# Altium footprint library FOOTPRINT.PcbLib: 132 footprints (part 6 of 9)
Each footprint in its own frame and in the unit in brackets; x right, y up, seen from the top. Pads: shape width x height; smd on the part's side, far side on the other; paste and mask are expansions set on the pad; w line width, h text height; cw(c..) or ccw(c..) is an arc to the next point about the centre after c.
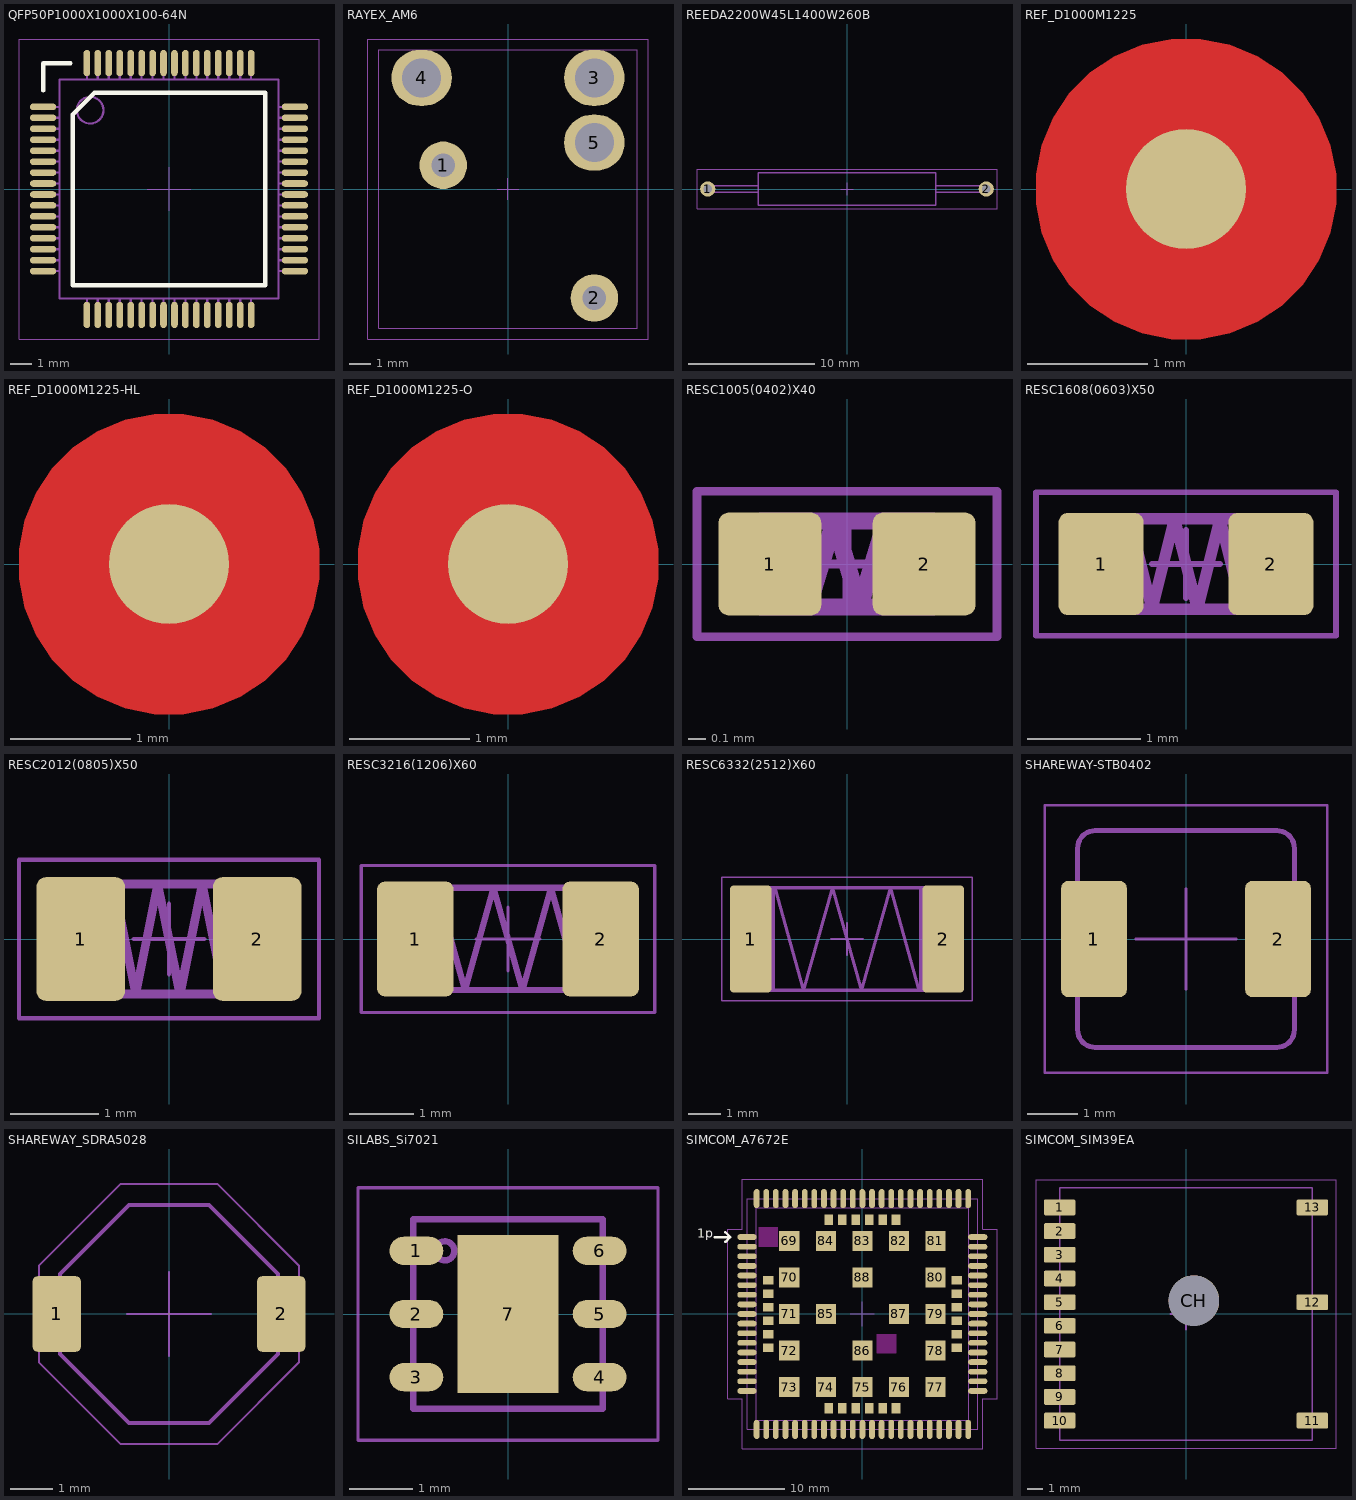
[diagram p5: the footprints below, top view; thin cyan lines are the x and y axes]

## QFP50P1000X1000X100-64N [mm] "TQFP, 64-Leads, Body 10.00x10.00mm, Pitch 0.50mm"
height 1
pads (64):
  oval 1.2x0.3 smd paste-0.025: 1(-5.75,3.75) 2(-5.75,3.25) 3(-5.75,2.75) 4(-5.75,2.25) 5(-5.75,1.75) 6(-5.75,1.25) 7(-5.75,0.75) 8(-5.75,0.25) 9(-5.75,-0.25) 10(-5.75,-0.75) 11(-5.75,-1.25) 12(-5.75,-1.75) 13(-5.75,-2.25) 14(-5.75,-2.75) 15(-5.75,-3.25) 16(-5.75,-3.75) 33(5.75,-3.75) 34(5.75,-3.25) 35(5.75,-2.75) 36(5.75,-2.25) 37(5.75,-1.75) 38(5.75,-1.25) 39(5.75,-0.75) 40(5.75,-0.25) 41(5.75,0.25) 42(5.75,0.75) 43(5.75,1.25) 44(5.75,1.75) 45(5.75,2.25) 46(5.75,2.75) 47(5.75,3.25) 48(5.75,3.75)
  oval 0.3x1.2 smd paste-0.025: 17(-3.75,-5.75) 18(-3.25,-5.75) 19(-2.75,-5.75) 20(-2.25,-5.75) 21(-1.75,-5.75) 22(-1.25,-5.75) 23(-0.75,-5.75) 24(-0.25,-5.75) 25(0.25,-5.75) 26(0.75,-5.75) 27(1.25,-5.75) 28(1.75,-5.75) 29(2.25,-5.75) 30(2.75,-5.75) 31(3.25,-5.75) 32(3.75,-5.75) 49(3.75,5.75) 50(3.25,5.75) 51(2.75,5.75) 52(2.25,5.75) 53(1.75,5.75) 54(1.25,5.75) 55(0.75,5.75) 56(0.25,5.75) 57(-0.25,5.75) 58(-0.75,5.75) 59(-1.25,5.75) 60(-1.75,5.75) 61(-2.25,5.75) 62(-2.75,5.75) 63(-3.25,5.75) 64(-3.75,5.75)
Top Overlay:
  lines w0.2: -5.75,4.5 -5.75,5.75 -4.5,5.75 ; -4.4,-4.4 -4.4,3.4 -3.4,4.4 4.4,4.4 4.4,-4 4.4,-4.4 -2.975,-4.4 -4.4,-4.4
Top Assembly:
  circle w0.1: c-3.6,3.6 r0.608
  lines w0.1: -6,-3.75 -5,-3.75 ; -6,-3.25 -5,-3.25 ; -6,-2.75 -5,-2.75 ; -6,-2.25 -5,-2.25 ; -6,-1.75 -5,-1.75 ; -6,-1.25 -5,-1.25 ; -6,-0.75 -5,-0.75 ; -6,-0.25 -5,-0.25 ; -6,0.25 -5,0.25 ; -6,0.75 -5,0.75 ; -6,1.25 -5,1.25 ; -6,1.75 -5,1.75 ; -6,2.25 -5,2.25 ; -6,2.75 -5,2.75 ; -6,3.25 -5,3.25 ; -6,3.75 -5,3.75 ; -3.75,-6 -3.75,-5 ; -3.75,5 -3.75,6 ; -3.25,-6 -3.25,-5 ; -3.25,5 -3.25,6 ; -2.75,-6 -2.75,-5 ; -2.75,5 -2.75,6 ; -2.25,-6 -2.25,-5 ; -2.25,5 -2.25,6 ; -1.75,-6 -1.75,-5 ; -1.75,5 -1.75,6 ; -1.25,-6 -1.25,-5 ; -1.25,5 -1.25,6 ; -0.75,-6 -0.75,-5 ; -0.75,5 -0.75,6 ; -0.25,-6 -0.25,-5 ; -0.25,5 -0.25,6 ; 0.25,-6 0.25,-5 ; 0.25,5 0.25,6 ; 0.75,-6 0.75,-5 ; 0.75,5 0.75,6 ; 1.25,-6 1.25,-5 ; 1.25,5 1.25,6 ; 1.75,-6 1.75,-5 ; 1.75,5 1.75,6 ; 2.25,-6 2.25,-5 ; 2.25,5 2.25,6 ; 2.75,-6 2.75,-5 ; 2.75,5 2.75,6 ; 3.25,-6 3.25,-5 ; 3.25,5 3.25,6 ; 3.75,-6 3.75,-5 ; 3.75,5 3.75,6 ; 5,-3.75 6,-3.75 ; 5,-3.25 6,-3.25 ; 5,-2.75 6,-2.75 ; 5,-2.25 6,-2.25 ; 5,-1.75 6,-1.75 ; 5,-1.25 6,-1.25 ; 5,-0.75 6,-0.75 ; 5,-0.25 6,-0.25 ; 5,0.25 6,0.25 ; 5,0.75 6,0.75 ; 5,1.25 6,1.25 ; 5,1.75 6,1.75 ; 5,2.25 6,2.25 ; 5,2.75 6,2.75 ; 5,3.25 6,3.25 ; 5,3.75 6,3.75 ; -5,-5 5,-5 5,5 -5,5 -5,-5
Top Courtyard:
  lines w0.05: -6.85,-6.85 6.85,-6.85 6.85,6.85 -6.85,6.85 -6.85,-6.85
Top Component Center:
  lines w0.05: -1,0 1,0 ; 0,-1 0,1
Top Designator:
  text "'.Comment'" at -1.425,-0.81 h0.65
  text "'.Designator'" at -1.425,0.351 h0.65
3D body "TQFP-64_10x10mm_P0.5mm.step": height 1.1, standoff 0, extent -6,-6 6,6

## RAYEX_AM6 [mm]
pads (5):
  round 2.2 hole 1.1: 1(-3,1.1) 2(4,-5.05)
  oval 2.8x2.6 hole 1.8: 3(4,5.15) 4(-4,5.15) 5(4,2.15)
Top Assembly:
  lines w0.05: -6,-6.45 -6,6.45 6,6.45 6,-6.45 -6,-6.45
Top Courtyard:
  lines w0.05: -6.5,-6.95 6.5,-6.95 6.5,6.95 -6.5,6.95 -6.5,-6.95
Top Component Center:
  lines w0.05: -0.5,0 0.5,0 ; 0,-0.5 0,0.5
Top Designator:
  text "'.Designator'" at -1.425,0.351 h0.65
  text "'.Comment'" at -1.425,-0.81 h0.65
3D body: height 9.9, standoff 0, extent -6,-6.45 6,6.45
3D body: height 0, standoff -2.8, extent -4.6,4.95 -3.4,5.35
3D body: height 0, standoff -2.8, extent 3.4,4.95 4.6,5.35
3D body: height 0, standoff -2.8, extent 3.4,1.95 4.6,2.35
3D body: height 0, standoff -2.8, extent -3.248,0.851 -2.75,1.35
3D body: height 0, standoff -2.8, extent 3.752,-5.299 4.25,-4.8

## REEDA2200W45L1400W260B [mm] "Reed Switch, Axial, Lead Spacing 22.00mm, Lead Widt 0.45mm, Body Length 14.00mm, Rect Body Width 2.60mm"
height 2.6
pads (2):
  round 1.2 hole 0.7: 1(-11,0) 2(11,0)
Top Assembly:
  lines w0.1: -7,-0.25 -11.1,-0.25 -11.1,0.25 -7,0.25 ; 7,-0.25 11.1,-0.25 11.1,0.25 7,0.25 ; -7,-1.3 -7,1.3 7,1.3 7,-1.3 -7,-1.3
Top Courtyard:
  lines w0.05: -11.85,-1.55 -11.85,1.55 11.85,1.55 11.85,-1.55 -11.85,-1.55
Top Component Center:
  lines w0.05: -0.5,0 0.5,0 ; 0,-0.5 0,0.5
Top Designator:
  text "'.Comment'" at -1.425,-0.752 h0.65
  text "'.Designator'" at -1.425,0.351 h0.65
3D body "REEDA_REEDA2200W45L1400W150B.x_t": height 2.61, standoff -1.93, extent -11.225,-1.3 11.225,1.3

## REF_D1000M1225 [mm]
pads (1):
  round 1 smd paste-100 mask+0.725: ""(0,0)
Top:
  pour cut-out: 0,-1.25 0.123,-1.25 0.365,-1.202 0.592,-1.108 0.797,-0.971 0.971,-0.797 1.108,-0.592 1.202,-0.365 1.25,-0.123 1.25,0 1.25,0.123 1.202,0.365 1.108,0.592 0.971,0.797 0.797,0.971 0.592,1.108 0.365,1.202 0.123,1.25 0,1.25 -0.123,1.25 -0.365,1.202 -0.592,1.108 -0.797,0.971 -0.971,0.797 -1.108,0.592 -1.202,0.365 -1.25,0.123 -1.25,0 -1.25,-0.123 -1.202,-0.365 -1.108,-0.592 -0.971,-0.797 -0.797,-0.971 -0.592,-1.108 -0.365,-1.202 -0.123,-1.25

## REF_D1000M1225-HL [mm]
pads (2):
  round 1 smd paste-100 mask+0.725: ""(0,0)
  round 1 on Mech21: ""(0,0)
Top:
  pour cut-out: 0,-1.25 0.123,-1.25 0.365,-1.202 0.592,-1.108 0.797,-0.971 0.971,-0.797 1.108,-0.592 1.202,-0.365 1.25,-0.123 1.25,0 1.25,0.123 1.202,0.365 1.108,0.592 0.971,0.797 0.797,0.971 0.592,1.108 0.365,1.202 0.123,1.25 0,1.25 -0.123,1.25 -0.365,1.202 -0.592,1.108 -0.797,0.971 -0.971,0.797 -1.108,0.592 -1.202,0.365 -1.25,0.123 -1.25,0 -1.25,-0.123 -1.202,-0.365 -1.108,-0.592 -0.971,-0.797 -0.797,-0.971 -0.592,-1.108 -0.365,-1.202 -0.123,-1.25

## REF_D1000M1225-O [mm]
pads (1):
  round 1 smd paste+0.05 mask+0.725: ""(0,0)
Top:
  pour cut-out: 0,-1.25 0.123,-1.25 0.365,-1.202 0.592,-1.108 0.797,-0.971 0.971,-0.797 1.108,-0.592 1.202,-0.365 1.25,-0.123 1.25,0 1.25,0.123 1.202,0.365 1.108,0.592 0.971,0.797 0.797,0.971 0.592,1.108 0.365,1.202 0.123,1.25 0,1.25 -0.123,1.25 -0.365,1.202 -0.592,1.108 -0.797,0.971 -0.971,0.797 -1.108,0.592 -1.202,0.365 -1.25,0.123 -1.25,0 -1.25,-0.123 -1.202,-0.365 -1.108,-0.592 -0.971,-0.797 -0.797,-0.971 -0.592,-1.108 -0.365,-1.202 -0.123,-1.25

## RESC1005(0402)X40 [mm] "Chip Resistor, 2-Leads, Body 1.00x0.50mm"
height 0.4
pads (2):
  rrect20% 0.6x0.6 smd: 1(-0.45,0) 2(0.45,0)
Top Assembly:
  region: 0.5,0.25 0.375,0.25 0.375,-0.248 0.5,-0.248
  rectangle: -0.5,-0.248 -0.375,0.25
  lines w0.1: -0.376,0.25 -0.226,-0.248 -0.076,0.25 0.075,-0.248 0.225,0.25 0.375,-0.248 ; -0.5,-0.25 0.5,-0.25 0.5,0.25 -0.5,0.25 -0.5,-0.25
Top Courtyard:
  lines w0.05: -0.875,-0.425 0.875,-0.425 0.875,0.425 -0.875,0.425 -0.875,-0.425
Top Component Center:
  lines w0.05: -0.2,0 0.2,0 ; 0,-0.2 0,0.2
Top Designator:
  text "'.Comment'" at 0.65,-0.376 h0.55
  text "'.Designator'" at 0.65,0.04 h0.6
3D body "RESC-SMD-0402(1005).step": height 0.4, standoff 0, extent -0.5,-0.25 0.5,0.25

## RESC1608(0603)X50 [mm] "Chip Resistor, 2-Leads, Body 1.55x0.85mm"
height 0.5
pads (2):
  rrect20% 0.75x0.9 smd: 1(-0.75,0) 2(0.75,0)
Top Assembly:
  rectangle: -0.8,-0.4 -0.5,0.4
  region: 0.8,0.4 0.5,0.4 0.5,-0.4 0.8,-0.4
  lines w0.1: -0.5,0.4 -0.3,-0.4 -0.1,0.4 0.1,-0.4 0.3,0.4 0.5,-0.4 ; -0.8,-0.4 0.8,-0.4 0.8,0.4 -0.8,0.4 -0.8,-0.4
Top Courtyard:
  lines w0.05: -1.325,-0.635 -1.325,0.635 1.325,0.635 1.325,-0.635 -1.325,-0.635
Top Component Center:
  lines w0.05: -0.3,0 0.3,0 ; 0,-0.3 0,0.3
Top Designator:
  text "'.Comment'" at 0.95,-0.482 h0.65
  text "'.Designator'" at 0.95,0.029 h0.65
3D body "RESC-SMD-0603(1608).step": height 0.5, standoff 0, extent -0.8,-0.4 0.8,0.4

## RESC2012(0805)X50 [mm] "Chip Resistor, 2-Leads, Body 2.00x1.20mm"
height 0.5
pads (2):
  rrect20% 1x1.4 smd: 1(-1,0) 2(1,0)
Top Assembly:
  region: 1,0.625 0.625,0.625 0.625,-0.625 1,-0.625
  rectangle: -1,-0.625 -0.625,0.625
  lines w0.1: -0.626,0.625 -0.376,-0.625 -0.126,0.625 0.125,-0.625 0.375,0.625 0.625,-0.625 ; -1,-0.625 -1,0.625 1,0.625 1,-0.625 -1,-0.625
Top Courtyard:
  lines w0.05: -1.7,-0.9 -1.7,0.9 1.7,0.9 1.7,-0.9 -1.7,-0.9
Top Component Center:
  lines w0.05: -0.4,0 0.4,0 ; 0,-0.4 0,0.4
Top Designator:
  text "'.Designator'" at 1.2,0.101 h0.65
  text "'.Comment'" at 1.2,-0.557 h0.65
3D body "RESC-SMD-0805(2012).step": height 0.5, standoff 0, extent -1,-0.625 1,0.625

## RESC3216(1206)X60 [mm] "Chip Resistor, 2-Leads, Body 3.20x1.60mm"
height 0.6
pads (2):
  rrect20% 1.2x1.8 smd: 1(-1.45,0) 2(1.45,0)
Top Assembly:
  region: 1.6,0.8 1.125,0.8 1.125,-0.8 1.6,-0.8
  rectangle: -1.6,-0.8 -1.125,0.8
  lines w0.1: -1.125,0.8 -0.675,-0.8 -0.225,0.8 0.225,-0.8 0.675,0.8 1.125,-0.8 ; -1.6,-0.8 1.6,-0.8 1.6,0.8 -1.6,0.8 -1.6,-0.8
Top Courtyard:
  lines w0.05: -2.3,-1.15 2.3,-1.15 2.3,1.15 -2.3,1.15 -2.3,-1.15
Top Component Center:
  lines w0.05: -0.5,0 0.5,0 ; 0,-0.5 0,0.5
Top Designator:
  text "'.Designator'" at 1.8,0.101 h0.65
  text "'.Comment'" at 1.8,-0.557 h0.65
3D body "RESC-SMD-1206(3216).step": height 0.6, standoff 0, extent -1.6,-0.8 1.6,0.8

## RESC6332(2512)X60 [mm] "Chip Resistor, 2-Leads, Body 6.30x3.20mm"
height 0.6
pads (2):
  rrect20% 1.3x3.35 smd: 1(-3,0) 2(3,0)
Top Assembly:
  region: 3.175,1.6 2.25,1.6 2.25,-1.6 3.175,-1.6
  rectangle: -3.175,-1.6 -2.25,1.6
  lines w0.1: -2.25,1.6 -1.35,-1.6 -0.45,1.6 0.45,-1.6 1.35,1.6 2.25,-1.6 ; -3.175,-1.6 -3.175,1.6 3.175,1.6 3.175,-1.6 -3.175,-1.6
Top Courtyard:
  lines w0.05: -3.9,-1.925 3.9,-1.925 3.9,1.925 -3.9,1.925 -3.9,-1.925
Top Component Center:
  lines w0.05: -0.5,0 0.5,0 ; 0,-0.5 0,0.5
Top Designator:
  text "'.Designator'" at 3.375,0.101 h0.65
  text "'.Comment'" at 3.375,-0.557 h0.65
3D body "RESC-SMD-2512(6332).step": height 0.6, standoff 0, extent -3.175,-1.6 3.175,1.6

## SHAREWAY-STB0402 [mm] "Power Inductor for Surface Mounting"
height 2
pads (2):
  rrect20% 1.3x2.3 smd: 1(-1.825,0) 2(1.825,0)
Top Assembly:
  lines w0.1: -2.15,-1 -2.3,-1 -2.3,1 -2.15,1 ; 2.15,-1 2.3,-1 2.3,1 2.15,1 ; -2.15,-1.8 ccw(c-1.8,-1.8) -1.8,-2.15 1.8,-2.15 ccw(c1.8,-1.8) 2.15,-1.8 2.15,1.8 ccw(c1.8,1.8) 1.8,2.15 -1.8,2.15 ccw(c-1.8,1.8) -2.15,1.8 -2.15,-1.8
Top Courtyard:
  lines w0.05: -2.8,-2.65 -2.8,2.65 2.8,2.65 2.8,-2.65 -2.8,-2.65
Top Component Center:
  lines w0.05: -1,0 1,0 ; 0,-1 0,-1 ; 0,-1 0,1 ; 0,1 0,1
Top Designator:
  text "'.Designator'" at -1.5,0.351 h0.65
  text "'.Comment'" at -1.5,-0.735 h0.65
3D body "Shareway-STB0402.x_t": height 2.01, standoff 0.01, extent -2.3,-2.15 2.3,2.15

## SHAREWAY_SDRA5028 [mm] "Power Inductor"
pads (2):
  rrect20% 1.15x1.8 smd: 1(-2.675,0) 2(2.675,0)
Top Assembly:
  lines w0.1: -2.6,-0.95 -0.95,-2.6 0.95,-2.6 2.6,-0.95 2.6,0.95 0.95,2.6 -0.95,2.6 -2.6,0.95 -2.6,-0.95
Top Courtyard:
  lines w0.05: -3.1,-1.15 -3.1,1.15 -1.15,3.1 1.15,3.1 3.1,1.15 3.1,-1.15 1.15,-3.1 -1.15,-3.1 -3.1,-1.15
Top Component Center:
  lines w0.05: -1,0 1,0 ; 0,-1 0,1
Top Designator:
  text "'.Designator'" at -1.225,0.076 h0.65
  text "'.Comment'" at -1.225,-0.51 h0.65
3D body: height 3, standoff 0, extent -2.6,-2.6 2.6,2.6

## SILABS_Si7021 [mm] "DFN, 6-Leads, Thermal Pad, Body 4.00x4.00mm"
height 0.8
pads (7):
  oval 0.85x0.45 smd: 1(-1.45,1) 2(-1.45,0) 3(-1.45,-1) 4(1.45,-1) 5(1.45,0) 6(1.45,1)
  rect 1.6x2.5 smd paste-100: 7(0,0)
Top Paste:
  region: -0.725,1.075 -0.725,0.25 -0.725,0.23 -0.71,0.193 -0.682,0.165 -0.645,0.15 -0.625,0.15 -0.25,0.15 -0.23,0.15 -0.193,0.165 -0.165,0.193 -0.15,0.23 -0.15,0.25 -0.15,1.075 -0.15,1.095 -0.165,1.132 -0.193,1.16 -0.23,1.175 -0.25,1.175 -0.625,1.175 -0.645,1.175 -0.682,1.16 -0.71,1.132 -0.725,1.095
  region: 0.725,1.075 0.725,0.25 0.725,0.23 0.71,0.193 0.682,0.165 0.645,0.15 0.625,0.15 0.25,0.15 0.23,0.15 0.193,0.165 0.165,0.193 0.15,0.23 0.15,0.25 0.15,1.075 0.15,1.095 0.165,1.132 0.193,1.16 0.23,1.175 0.25,1.175 0.625,1.175 0.645,1.175 0.682,1.16 0.71,1.132 0.725,1.095
  region: 0.725,-1.075 0.725,-0.25 0.725,-0.23 0.71,-0.193 0.682,-0.165 0.645,-0.15 0.625,-0.15 0.25,-0.15 0.23,-0.15 0.193,-0.165 0.165,-0.193 0.15,-0.23 0.15,-0.25 0.15,-1.075 0.15,-1.095 0.165,-1.132 0.193,-1.16 0.23,-1.175 0.25,-1.175 0.625,-1.175 0.645,-1.175 0.682,-1.16 0.71,-1.132 0.725,-1.095
  region: -0.725,-1.075 -0.725,-0.25 -0.725,-0.23 -0.71,-0.193 -0.682,-0.165 -0.645,-0.15 -0.625,-0.15 -0.25,-0.15 -0.23,-0.15 -0.193,-0.165 -0.165,-0.193 -0.15,-0.23 -0.15,-0.25 -0.15,-1.075 -0.15,-1.095 -0.165,-1.132 -0.193,-1.16 -0.23,-1.175 -0.25,-1.175 -0.625,-1.175 -0.645,-1.175 -0.682,-1.16 -0.71,-1.132 -0.725,-1.095
Top Assembly:
  circle w0.1: c-1,1 r0.15
  circle w0.1: c0,0 r0.7
  lines w0.1: -1.5,-1.5 -1.5,1.5 1.5,1.5 1.5,-1.5 -1.5,-1.5
Top Courtyard:
  lines w0.05: -2.375,-2 2.375,-2 2.375,2 -2.375,2 -2.375,-2
Top Component Center:
  lines w0.05: -0.5,0 0.5,0 ; 0,-0.5 0,0.5
Top Designator:
  text "'.Comment'" at 0.282,-1.425 h0.65
  text "'.Designator'" at -0.301,-1.425 h0.65
3D body "SILABS_Si7021.x_t": height 0.86, standoff 0.01, extent -1.518,-1.5 1.518,1.5

## SIMCOM_A7672E [mm]
pads (124):
  oval 2x0.6 smd paste-100: 1(-12,8) 2(-12,7) 3(-12,6) 4(-12,5) 5(-12,4) 6(-12,3) 7(-12,2) 8(-12,1) 9(-12,0) 10(-12,-1) 11(-12,-2) 12(-12,-3) 13(-12,-4) 14(-12,-5) 15(-12,-6) 16(-12,-7) 17(-12,-8) 35(12,-8) 36(12,-7) 37(12,-6) 38(12,-5) 39(12,-4) 40(12,-3) 41(12,-2) 42(12,-1) 43(12,0) 44(12,1) 45(12,2) 46(12,3) 47(12,4) 48(12,5) 49(12,6) 50(12,7) 51(12,8)
  oval 0.6x2 smd paste-100: 18(-8,-12) 19(-7,-12) 20(-6,-12) 21(-5,-12) 22(-4,-12) 23(-3,-12) 24(-2,-12) 25(-1,-12) 26(0,-12) 27(1,-12) 28(2,-12) 29(3,-12) 30(4,-12) 31(5,-12) 32(6,-12) 33(7,-12) 34(8,-12) 52(8,12) 53(7,12) 54(6,12) 55(5,12) 56(4,12) 57(3,12) 58(2,12) 59(1,12) 60(0,12) 61(-1,12) 62(-2,12) 63(-3,12) 64(-4,12) 65(-5,12) 66(-6,12) 67(-7,12) 68(-8,12) 89(-11,-12) 90(-10,-12) 91(-9,-12) 92(9,-12) 93(10,-12) 94(11,-12) 95(11,12) 96(10,12) 97(9,12) 98(-9,12) 99(-10,12) 100(-11,12)
  rrect0% 2.1x2.1 smd paste-100: 69(-7.6,7.6) 70(-7.6,3.8) 71(-7.6,0) 72(-7.6,-3.8) 73(-7.6,-7.6) 74(-3.8,-7.6) 75(0,-7.6) 76(3.8,-7.6) 77(7.6,-7.6) 78(7.6,-3.8) 79(7.6,0) 80(7.6,3.8) 81(7.6,7.6) 82(3.8,7.6) 83(0,7.6) 84(-3.8,7.6) 85(-3.8,0) 86(0,-3.8) 87(3.8,0) 88(0,3.8)
  rrect0% 1.1x0.9 smd paste-100: 101(-9.8,3.5) 102(-9.8,2.1) 103(-9.8,0.7) 104(-9.8,-0.7) 105(-9.8,-2.1) 106(-9.8,-3.5) 113(9.8,-3.5) 114(9.8,-2.1) 115(9.8,-0.7) 116(9.8,0.7) 117(9.8,2.1) 118(9.8,3.5)
  rrect0% 0.9x1.1 smd paste-100: 107(-3.5,-9.8) 108(-2.1,-9.8) 109(-0.7,-9.8) 110(0.7,-9.8) 111(2.1,-9.8) 112(3.5,-9.8) 119(3.5,9.8) 120(2.1,9.8) 121(0.7,9.8) 122(-0.7,9.8) 123(-2.1,9.8) 124(-3.5,9.8)
Top keep-out:
  rectangle: 1.475,-4.125 3.525,-2.075
  rectangle: -10.825,6.975 -8.775,9.025
Top Overlay:
  lines w0.25: -15.35,8 -13.75,8 ; -14.25,7.5 -13.75,8 ; -14.25,8.5 -13.75,8
  text "1p" at -17.201,7.627 h1.6
Top Paste:
  drawing of 208 lines, arcs and shapes, not listed
Top Assembly:
  drawing of 168 lines, arcs and shapes, not listed
Top Courtyard:
  lines w0.05: -14,-8.8 -14,8.8 -12.5,8.8 -12.5,14 12.5,14 12.5,8.8 14,8.8 14,-8.8 12.5,-8.8 12.5,-14 -12.5,-14 -12.5,-8.8 -14,-8.8
Top Component Center:
  lines w0.05: -1.25,0 1.25,0 ; 0,-1.25 0,1.25
Top Designator:
  text "'.Comment'" at -1.45,-1.035 h0.65
  text "'.Designator'" at -1.45,0.626 h0.65

## SIMCOM_SIM39EA [mm]
pads (14):
  rrect20% 2x1 smd: 1(-8,6.75) 2(-8,5.25) 3(-8,3.75) 4(-8,2.25) 5(-8,0.75) 6(-8,-0.75) 7(-8,-2.25) 8(-8,-3.75) 9(-8,-5.25) 10(-8,-6.75) 11(8,-6.75) 12(8,0.75) 13(8,6.75)
  round 3.2 hole 3.2: CH(0.5,0.85)
Top Assembly:
  lines w0.1: -8,-8 8,-8 8,8 -8,8 -8,-8
Top Courtyard:
  lines w0.05: -9.5,-8.5 9.5,-8.5 9.5,8.5 -9.5,8.5 -9.5,-8.5
Top Component Center:
  lines w0.1: -1,0 1,0 ; 0,-1 0,1
Top Designator:
  text "'.Comment'" at -1.45,-1.035 h0.65
  text "'.Designator'" at -1.45,0.626 h0.65
3D body: height 6.7, standoff -0.8, extent 0,0.35 1,1.35
3D body: height 6, standoff 2, extent -7.5,-7.5 7.5,7.5
3D body: height 2, standoff 0.6, extent -7,-7.4 7,7.4
3D body: height 0.6, standoff 0, extent -8,-8 8,8